# Altium integrated library GBA.IntLib: 80 symbols (continued)
## FH39-45S-0.3SHW(10) (continued)
FFC FPC Connectors Horizontal Mounting Angle Beige 0.3 mm - Pitch 45 Positions; Manufacturer: Hirose; Manufacturer Part Number: FH39-45S-0.3SHW(10); Supplier 1: Mouser; RoHS: Yes; Category: FFC / FPC; Stock 1: 11777; Pricing 1: 1=2,46000, 10=2,05000, 50=2,05000, 100=1,92000, 250=1,73000, 500=1,60000, 1000=1,37000, 2500=1,28000, 5000=1,21000, 10000=1,18000 (USD); ComponentLink1URL: https://datasheet.ciiva.com/5138/e58018001-27728-5138044.pdf?src-supplier=Mouser; ComponentLink1Description: https://datasheet.ciiva.com/5138/e58018001-27728-5138044.pdf?src-supplier=Mouser
footprint FH3945S03SHW10
pins: 1, 2, 3, 4, 5, 6, 7, 8, 9, 10, 11, 12, 13, 14, 15, 16, 17, 18, 19, 20, 21, 22, 23, 24, 25, 26, 27, 28, 29, 30, 31, 32, 33, 34, 35, 36, 37, 38, 39, 40, 41, 42, 43, 44, 45, 46, 47

## GBA Switch Original
designator SW?, comment Interruptor ON off original
Interruptor Original On OFF
footprint SWITCH_ORIGINAL
pins: 1, 2, 3, 4

## GCM1885C2A300JA16D
designator C?, comment 30pF 100V C0G 5%
Condensadores de cerámica multicapa (MLCC- SMD/SMT) 30pF 100Volts C0G 5%; Manufacturer: Murata; Manufacturer Part Number: GCM1885C2A300JA16D; Supplier 1: Mouser; Stock 1: 7933; Pricing 1: 1=0.15, 10=0.115, 50=0.115, 100=0.054, 1000=0.031, 10000=0.022 (USD); Mount: Surface Mount; Case/Package: 0603; Case Code (Imperial): 0603; Case Code (Metric): 1608; Min Operating Temperature: -25°C; Max Operating Temperature: 125°C; Voltage Rating: 100V; Capacitance: 30pF; Voltage Rating (DC): 100V; Tolerance: 5%; Packaging: Tape and Reel; Package Quantity: 4000; Dielectric: C0G; Termination: SMD/SMT; Length: 1.6mm; Height: 0.8mm; Width: 0.8mm; Thickness: 0.035inch; Depth: 0.8mm; Ratings: AEC-Q200; Radiation Hardening: No; ComponentLink1URL: http://search.murata.co.jp/Ceramy/image/img/w_hinm/S0717E.pdf?src-supplier=Digi-Key; ComponentLink1Description: http://search.murata.co.jp/Ceramy/image/img/w_hinm/S0717E.pdf?src-supplier=Digi-Key; ComponentLink2URL: http://www.murata.com/products/catalog/pdf/c03e.pdf?src-supplier=Avnet; ComponentLink2Description: http://www.murata.com/products/catalog/pdf/c03e.pdf?src-supplier=Avnet; Supplier Part Number 1: 81-GCM1885C2A300JA6D
footprint C 0603/1608
pins: 1, 2

## GRM21BR61E226ME44K
designator C?, comment 22uF X5R 25V 0805
Multilayer Ceramic Capacitors MLCC - SMD/SMT; Manufacturer: Murata; Manufacturer Part Number: GRM21BR61E226ME44K; Tolerance: 20%; Supplier 1: Mouser; Stock 1: 50478; Pricing 1: 1=0.54, 10=0.383, 50=0.383, 100=0.252, 1000=0.159, 10000=0.148 (USD); Mount: Surface Mount; Case/Package: 0805; Weight: 0.000335oz; Case Code (Imperial): 0805; Case Code (Metric): 2012; Min Operating Temperature: -55°C; Max Operating Temperature: 85°C; Packaging: Tape and Reel; Capacitance: 22uF; Voltage Rating: 25V; Dielectric: X5R; Termination: SMD/SMT; Composition: Ceramic; Voltage Rating (DC): 25V; Package Quantity: 10000; Length: 0.079inch; Height: 1.25mm; Width: 1.25mm; Thickness: 0.057inch; Supplier Part Number 1: 81-GRM21BR61E226ME4K
footprint C 0805/2012
pins: 1, 2

## GRM188R60J474KA01D
designator C?, comment 0.47uF 6.3 X5R 0603
CAP CER 0.47UF 6.3V X5R 0603; Manufacturer: Murata Electronics North America; Manufacturer Part Number: GRM188R60J474KA01D; Tolerance: ±10%; Notification: Current market demand for these product types have resulted in fluctuating and extending lead times. Lead times may differ.; Supplier 1: Digi-Key; RoHS: RoHS Compliant; Category: Capacitors; Stock 1: 40000; Pricing 1: 1=0.13, 10=0.092, 100=0.0467, 500=0.032, 1000=0.0283 (GBP); Packaging: Cut Tape (CT); Part Status: Not For New Designs; Voltage - Rated: 6.3V; Temperature Coefficient: X5R; Operating Temperature: -55°C ~ 85°C; Features: -; Ratings: -; Applications: General Purpose; Mounting Type: Surface Mount, MLCC; Package / Case: 0603 (1608 Metric); Size / Dimension: 0.063" L x 0.031" W (1.60mm x 0.80mm); Height - Seated (Max): -; Thickness (Max): 0.035" (0.90mm); Lead Spacing: -; Lead Style: -; ComponentLink1URL: https://www.murata.com/~/media/webrenewal/support/library/catalog/products/capacitor/mlcc/c02e.ashx?la=en-us; ComponentLink1Description: https://www.murata.com/~/media/webrenewal/support/library/catalog/products/capacitor/mlcc/c02e.ashx?la=en-us; Supplier Part Number 1: 490-1548-1-ND
footprint C 0603/1608
pins: 1, 2

## GRM188R61E106KA73D
designator C?, comment 10uF 25V X5R 0603
Cap Ceramic 10uF 25V X5R 10% SMD 0603 85°C Paper T/R; Manufacturer 1: Murata; Manufacturer Part Number 1: GRM188R61E106KA73D; Supplier 1: Mouser; Stock 1: 265910; Pricing 1: 1=0.37000, 10=0.25900, 50=0.25900, 100=0.15500, 500=0.11600, 1000=0.09800, 4000=0.07600, 8000=0.07000, 10000=0.07000, 12000=0.06300 (USD); RoHS: No; Case/Package: 0603; Supplier Part Number 1: 81-GRM188R61E106KA3D
footprint C 0603/1608
pins: 1, 2

## GRM188R61E225MA12D
designator C?, comment 2.2uF 25V X5R 0603
CAP CER 2.2UF 25V X5R 0603; Manufacturer 1: Murata; Manufacturer Part Number 1: GRM188R61E225MA12D; Tolerance: 20%; Supplier 1: Mouser; Stock 1: 103424; Pricing 1: 1=0,16000, 10=0,11500, 50=0,11500, 100=0,05400, 1000=0,03200, 10000=0,02300 (USD); RoHS: Yes; Mount: Surface Mount; Case/Package: 0603; Weight: 0.000222oz; Case Code (Metric): 1608; Case Code (Imperial): 0603; Min Operating Temperature: -55°C; Max Operating Temperature: 85°C; Capacitance: 2.2uF; Packaging: Tape and Reel; Voltage Rating: 25V; Dielectric: X5R; Termination: SMD/SMT; Composition: Ceramic; Voltage Rating (DC): 25V; Package Quantity: 4000; Length: 0.063inch; Height: 0.8mm; Width: 0.031inch; Thickness: 0.035inch; ComponentLink1URL: http://www.mouser.com/ds/2/281/c02e-2905.pdf?src-supplier=Mouser; ComponentLink1Description: http://www.mouser.com/ds/2/281/c02e-2905.pdf?src-supplier=Mouser; ComponentLink2URL: http://search.murata.co.jp/Ceramy/image/img/A01X/G101/ENG/GRM188R61E225MA12-01.pdf?src-supplier=Digi-Key; ComponentLink2Description: http://search.murata.co.jp/Ceramy/image/img/A01X/G101/ENG/GRM188R61E225MA12-01.pdf?src-supplier=Digi-Key; Supplier Part Number 1: 81-GRM188R61E225MA2D
footprint C 0603/1608
pins: 1, 2

## L/R Shoulder
designator J?, comment R/L Shoulder
Buy on Aliexpress
footprint SHOULDER_BUTTON
pins: GND, SH, SW

## LR2512-23R010F4
designator RSENSE?, comment Sense Resistor 0.01Ohm 3W 2512 1%
Low Resistors & Current Sense Resistors - Surface Mount 0.01Ohms ±1% 3W 2512 RoHS
footprint R2512
pins: 1, 2

## LTST-C281KGKT
designator LED?, comment Green 0402
Green 0603 130° Water Clear 35 mcd 2.4 V Surface Mount LED Chip; Manufacturer: Vishay Lite-On; Manufacturer Part Number: LTST-C281KGKT; Lens Color: Colorless; Power Rating: 75mW; Luminous Intensity: 35mcd; Forward Current: 20mA; Forward Voltage: 2V; Lens Style: Diffused,Colorless,Clear,Rectangular; Dominant Wavelength: 571nm; Number of Elements: 1; Reverse Voltage: 5V; Supplier 1: Mouser; RoHS: Yes; Category: LEDs; Stock 1: 168688; Pricing 1: 1=0,31000, 10=0,24500, 50=0,24500, 100=0,11100, 500=0,10000, 1000=0,08200, 5000=0,07100, 10000=0,05600, 25000=0,05300, 50000=0,04700 (USD); Mount: Surface Mount; Case/Package: SMD/SMT; Number of Pins: 2; Color: Green; Min Operating Temperature: -30°C; Max Operating Temperature: 85°C; Packaging: Tape and Reel; Viewing Angle: 130°; Package Quantity: 3000; Illumination Color: Green; Lens Transparency: Clear; Test Current: 20mA; Power Dissipation: 75mW; Number of LEDs: 1; Series: -; Length: 1mm; Width: 0.5mm; Height: 0.35mm; Depth: 0.5mm; Lead Free: Lead Free; RoHS Compliant: Yes; ComponentLink1URL: https://datasheet.ciiva.com/4269/dwonloadfilehandler-ashxtxtspecnods22-2008-0170-4269603.pdf?src-supplier=Arrow+Electronics; ComponentLink1Description: https://datasheet.ciiva.com/4269/dwonloadfilehandler-ashxtxtspecnods22-2008-0170-4269603.pdf?src-supplier=Arrow+Electronics; ComponentLink2URL: https://datasheet.ciiva.com/2958/s-110-ltst-c281kgkt-2958301.pdf?src-supplier=Digi-Key; ComponentLink2Description: https://datasheet.ciiva.com/2958/s-110-ltst-c281kgkt-2958301.pdf?src-supplier=Digi-Key; Supplier Part Number 1: 859-LTST-C281KGKT
footprint LED 0402
pins: 1 K, 2 A
text: GREEN

## LTST-C281TBKT
designator LED?, comment BLue 0402
0402 Blue Color Surface Mount LED With Water Clear Lens; Manufacturer: Vishay Lite-On; Manufacturer Part Number: LTST-C281TBKT; Lens Color: Colorless; Forward Voltage: 2.9V; Viewing Angle: 130°; Test Current: 5mA; Dominant Wavelength: 473nm; Luminous Intensity: 28mcd; Supplier 1: Mouser; RoHS: Yes; Category: LEDs; Stock 1: 18533; Pricing 1: 1=0,39000, 10=0,30600, 50=0,30600, 100=0,13800, 500=0,12500, 1000=0,10300, 5000=0,08800, 10000=0,07100, 25000=0,06600, 50000=0,05900 (USD); Mount: Surface Mount; Case/Package: 0402; Color: Blue; Case Code (Metric): 1005; Case Code (Imperial): 0402; Min Operating Temperature: -20°C; Max Operating Temperature: 80°C; Lens Style: Clear; Lens Transparency: Clear; Package Quantity: 3000; Illumination Color: Blue; Forward Current: 5mA; Packaging: Tape and Reel; Length: 1mm; Width: 0.5mm; Height: 0.35mm; Lead Free: Lead Free; ComponentLink1URL: http://optoelectronics.liteon.com/UpLoad/file/2009%20ShortForm%20-%20SMD%20LED%20(P022-P048).pdf?src-supplier=Future+Electronics; ComponentLink1Description: http://optoelectronics.liteon.com/UpLoad/file/2009%20ShortForm%20-%20SMD%20LED%20(P022-P048).pdf?src-supplier=Future+Electronics; Supplier Part Number 1: 859-LTST-C281TBKT
footprint LED 0402
pins: 1 K, 2 A
text: BLUE

## MAX17260SETD+
designator U?, comment Fuel Gauge MAX17260
Gestión de baterías 5.1 A 1-Cell Fuel Gauge with ModelGauge m5 EZ and Optional High-SideCurrent Sensing; Manufacturer: Maxim Integrated; Manufacturer Part Number: MAX17260SETD+; Empaquetado / Estuche: TDFN-EP-14; Producto: Fuel Gauges; Estilo de montaje: SMD/SMT; Tipo de batería: Li+, LiFePO4; CNHTS: 8542319000; Kit de desarrollo: MAX17260XEVKIT#; Temperatura operativa máxima: + 85 C; Temperatura operativa mínima: - 40 C; Corriente de suministro operativa: 15 uA; Voltaje operativo de suministro: 2.3 V to 4.9 V; Tipo de producto: Battery Management; Cantidad estándar de paquetes: 100; Subcategoría: PMIC - Power Management ICs; Product Status: New Product; Supplier 1: Mouser; RoHS: RoHS Compliant; Category: Gestión de baterías; Stock 1: 287; Pricing 1: 1=1.96, 25=1.34, 50=1.09, 250=1.07, 1000=1.01 (EUR); Serie: MAX17260; Marca: Maxim Integrated; HTS Code: 8542390001; Fabricante: Maxim Integrated; RoHS - Mouser: Y; Minimum Order Quantity: 1; Reeling: False; ComponentLink1URL: http://www.mouser.com/datasheet/2/256/MAX17260-1369516.pdf; ComponentLink1Description: http://www.mouser.com/datasheet/2/256/MAX17260-1369516.pdf; Supplier Part Number 1: 700-MAX17260SETD+
footprint TDFN14-1.7X2.3MM (T1433+2C Maxim code)
pins: 1 TH, 2 NC, 3 NC, 4 NC, 5 NC, 6 BATT, 7 CSN, 8 GND, 9 CSPL, 10 CSPH, 11 REG, 12 ALRT, 13 SDA, 14 SCL, 15 PAD

## MAX77757JEFG420+
designator U?, comment 3A USB C Charger  Supplier Part Number 1: MAX77757JEFG420+
Gestión de baterías 14V Input, 3A USB Type C Autonomous Charger; Manufacturer: Maxim; Supplier 1: Avnet; Manufacturer Part Number: MAX77757JEFG420+; RoHS: No; Pricing 1: 624=2,08051, 1248=2,01751, 2496=1,95451, 3744=1,89151, 4992=1,82851, 6240=1,76551, 62400=1,70251 (USD)
footprint 21-100385_90-100128_MXM (Footprint not found)
pins: 1 BST, 2 INOKB, 3 STAT, 4 CC2, 5 CC1, 6 DP, 7 DN, 8 ENBST, 9 GND, 10 VDD, 11 THM, 12 IFAST, 13 BATT, 14 BATT, 15 SYS, 16 SYS, 17 PVL, 18 PGND, 19 PGND, 20 LX, 21 LX, 22 BYP, 23 CHGIN, 24 CHGIN

## MAX98300ETA+T
designator U?, comment Mono Amplifier 2.6W
MAX98300 Series 5.5 V 2.6 W Class D Mono Surface Mount Audio Amplifier - TDFN-8; Manufacturer: Maxim; Manufacturer Part Number: MAX98300ETA+T; Voltage Gain: 12dB; Min Supply Voltage: 2.6V; Max Supply Voltage: 5.5V; Common Mode Rejection Ratio: 50dB; Max Power Dissipation: 953.5mW; Nominal Supply Current: 2mA; Power Supply Rejection Ratio (PSRR): 70dB; Number of Channels: 1; Max Output Current: 600mA; Load Impedance: 4R; Supplier 1: Mouser; RoHS: Yes; Category: Amplifiers - Audio; Stock 1: 8609; Pricing 1: 1=1,59000, 10=1,44000, 25=1,35000, 50=1,35000, 100=1,16000, 250=1,08000, 500=0,94500, 1000=0,81000, 10000=0,78200 (USD); Mount: Surface Mount; Number of Pins: 8; Contact Plating: Tin,Matte; Min Operating Temperature: -40°C; Max Operating Temperature: 85°C; Package Quantity: 2500; Packaging: Tape and Reel; Output Power: 2.6W; Max Output Power: 2.6W; Series: -; Supply Current: 2mA; Radiation Hardening: No; REACH SVHC: Unknown; RoHS Compliant: Yes; ComponentLink1URL: https://datasheet.ciiva.com/29639/max98300-29639253.pdf?src-supplier=Digi-Key; ComponentLink1Description: https://datasheet.ciiva.com/29639/max98300-29639253.pdf?src-supplier=Digi-Key; ComponentLink2URL: https://datasheet.ciiva.com/2968/max98300-2968003.pdf?src-supplier=Avnet; ComponentLink2Description: https://datasheet.ciiva.com/2968/max98300-2968003.pdf?src-supplier=Avnet; Supplier Part Number 1: 700-MAX98300ETA+T
footprint SON50P200X200X80-9N-D
pins: 1 IN+, 2 IN-, 3 ~{SHDN}, 4 GAIN, 5 PGND, 6 OUT-, 7 OUT+, 8 PVDD, 9 EP

## MIC2877-AYFT-TR
designator U?, comment Boost adjustable 2A
Conv DC-DC 2.5V to 5.5V Synchronous Step Up Single-Out 2.5V to 5.5V 2A 8-Pin FTQFN T/R; Manufacturer: Microchip; Manufacturer Part Number: MIC2877-AYFT-TR; Supplier 1: Mouser; RoHS: Yes; Category: Voltage Regulators - Switching; Stock 1: 4903; Pricing 1: 1=1,17000, 10=1,17000, 50=0,98600, 100=0,90000, 1000=0,90000, 10000=0,89900 (USD); Mount: Surface Mount; Number of Pins: 8; Packaging: Tape and Reel; RoHS Compliant: Yes; ComponentLink1URL: http://www.microchip.com/mymicrochip/filehandler.aspx?ddocname=en601345&src-supplier=Digi-Key; ComponentLink1Description: http://www.microchip.com/mymicrochip/filehandler.aspx?ddocname=en601345&src-supplier=Digi-Key; Supplier Part Number 1: 579-MIC2877-AYFT-TR
footprint MIC2877AYFTTR
pins: 1 VIN, 2 AGND, 3 PGND, 4 SW, 5 VOUT, 6 EN, 7 FB, 8 PG

## MMZ1608B121CTAH0
designator B?, comment 120OHM 0603 1LN
FERRITE BEAD 120 OHM 0603 1LN; Manufacturer: TDK Corporation; Manufacturer Part Number: MMZ1608B121CTAH0; Filter Type: Signal Line; Current Rating (Max): 600mA; DC Resistance (DCR) (Max): 150 mOhm; Supplier 1: Digi-Key; RoHS: RoHS Compliant; Category: Filters; Stock 1: 139504; Pricing 1: 1=0.09, 10=0.062, 25=0.056, 50=0.0504, 100=0.0371, 250=0.02692, 500=0.02468, 1000=0.02132 (EUR); Packaging: Cut Tape (CT); Part Status: Active; Ratings: -; Operating Temperature: -55°C ~ 125°C; Package / Case: 0603 (1608 Metric); Mounting Type: Surface Mount; Height (Max): 0.030" (0.75mm); Size / Dimension: 0.063" L x 0.032" W (1.60mm x 0.80mm); ComponentLink1URL: https://product.tdk.com/info/en/catalog/datasheets/beads_commercial_signal_mmz1608_en.pdf; ComponentLink1Description: https://product.tdk.com/info/en/catalog/datasheets/beads_commercial_signal_mmz1608_en.pdf; Supplier Part Number 1: 445-2164-1-ND
footprint R 0603/1608
pins: 1, 2

## NCP15XH103F03RC
designator THR?, comment NTC 10K 3380K 0402
THERMISTOR NTC 10KOHM 3380K 0402; Manufacturer: Murata Electronics North America; Manufacturer Part Number: NCP15XH103F03RC; Resistance Tolerance: ±1%; B25/85: 3434K; B25/100: 3455K; Supplier 1: Digi-Key; RoHS: RoHS Compliant; Category: Sensors, Transducers; Stock 1: 432156; Pricing 1: 1=0.11, 5=0.106, 10=0.094, 25=0.0868, 50=0.0696, 100=0.0596, 500=0.05216, 1000=0.04471, 5000=0.03974 (GBP); Packaging: Cut Tape (CT); Part Status: Active; Resistance in Ohms @ 25°C: 10k; B Value Tolerance: ±1%; B0/50: -; B25/50: 3380K; B25/75: -; Operating Temperature: -40°C ~ 125°C; Length - Lead Wire: -; Mounting Type: Surface Mount; Package / Case: 0402 (1005 Metric); ComponentLink1URL: https://www.murata.com/en-us/api/pdfdownloadapi?cate=&partno=NCP15XH103F03RC; ComponentLink1Description: https://www.murata.com/en-us/api/pdfdownloadapi?cate=&partno=NCP15XH103F03RC; Supplier Part Number 1: 490-4801-1-ND
footprint R 0402/1005
pins: 1, 2

## NRH2410T6R8MN
designator L?, comment 6.8uH 0,.7A  Supplier Part Number 1: 963-NRH2410T6R8MN
Inductor Power Shielded Wirewound 6.8uH 20% 100KHz Ferrite 0.57A 0.492Ohm DCR T/R; Manufacturer: Taiyo Yuden; Manufacturer Part Number: NRH2410T6R8MN; Current Rating: 570mA; Saturation Current: 750mA; Self Resonant Frequency: 43MHz; DC Resistance (DCR): 492mR; Supplier 1: Mouser; RoHS: Yes; Category: Fixed Inductors; Stock 1: 34335; Pricing 1: 1=0,23000, 10=0,15400, 50=0,15400, 100=0,12400, 1000=0,09100, 10000=0,06800 (USD); Mount: Surface Mount; Case/Package: Nonstandard; Number of Pins: 2; Core Material: Ferrite; Min Operating Temperature: -25°C; Max Operating Temperature: 120°C; Tolerance: 20%; Shielding: Shielded; Packaging: Tape and Reel; Inductance: 6.8uH; Resistor Type: Wirewound; Test Frequency: 100kHz; Package Quantity: 2500; Inductance Tolerance: 20%; Max DC Current: 750mA; Termination: SMD/SMT; Series: NRH; Length: 2.4mm; Width: 0.094inch; Height: 1mm; Height - Seated (Max): 0.039inch; Lead Pitch: 1.45mm; Depth: 2.5mm; Radiation Hardening: No; RoHS Compliant: Yes; REACH SVHC: No SVHC; Halogen Free: Halogen Free; ComponentLink1URL: https://datasheet.ciiva.com/1043/nrh2410t6r8mn-ss-1043809.pdf?src-supplier=Digi-Key; ComponentLink1Description: https://datasheet.ciiva.com/1043/nrh2410t6r8mn-ss-1043809.pdf?src-supplier=Digi-Key; ComponentLink2URL: https://datasheet.ciiva.com/8502/nrh2410t6r8mn-ss-8502817.pdf?src-supplier=Avnet; ComponentLink2Description: https://datasheet.ciiva.com/8502/nrh2410t6r8mn-ss-8502817.pdf?src-supplier=Avnet; ComponentLink3URL: https://datasheet.ciiva.com/25606/0900766b810b3cd2-25606903.pdf?src-supplier=RSComponents; ComponentLink3Description: https://datasheet.ciiva.com/25606/0900766b810b3cd2-25606903.pdf?src-supplier=RSComponents
footprint NRH2410T6R8MN
pins: 1, 2

## NSR0240HT1G
designator D?, comment 40V 250mA SOD323  Supplier Part Number 1: 863-NSR0240HT1G
DIODE SCHOTTKY 40V 250MA SOD323; Manufacturer: ON Semiconductor; Manufacturer Part Number: NSR0240HT1G; Max Surge Current: 1A; Recovery Time: 3ns; Peak Reverse Current: 10uA; Forward Voltage: 710mV; Power Dissipation: 270mW; Element Configuration: Single; Supplier 1: Mouser; RoHS: Yes; Stock 1: 30582; Pricing 1: 1 = 0,23000, 10 = 0,15400, 50 = 0,15400, 100 = 0,06500, 1000 = 0,04400, 10000 = 0,03000 (USD); Case/Package: SOD-323-2; Number of Pins: 2; Contact Plating: Tin; Min Operating Temperature: -55°C; Max Operating Temperature: 150°C; Package Quantity: 1; Forward Current: 250mA; Packaging: Tape and Reel; Max Reverse Leakage Current: 10uA; Average Rectified Current: 250mA; Reverse Recovery Time: 3ns; Max Repetitive Reverse Voltage (Vrrm): 40V; Peak Non-Repetitive Surge Current: 1A; Max Forward Surge Current (Ifsm): 1A; Max Reverse Voltage (DC): 40V; Length: 1.8mm; Height: 1mm; Width: 1.35mm; Radiation Hardening: No; REACH SVHC: No SVHC; Lead Free: Lead Free; ComponentLink1URL: https://datasheet.ciiva.com/4714/nsr0240h-d-113658-4714368.pdf?src-supplier=Mouser; ComponentLink1Description: https://datasheet.ciiva.com/4714/nsr0240h-d-113658-4714368.pdf?src-supplier=Mouser; ComponentLink2URL: https://datasheet.ciiva.com/8293/nsr0240h-d-8293840.pdf?src-supplier=Avnet; ComponentLink2Description: https://datasheet.ciiva.com/8293/nsr0240h-d-8293840.pdf?src-supplier=Avnet; ComponentLink3URL: https://datasheet.ciiva.com/25949/nsr0240h-d-25949637.pdf?src-supplier=Avnet+Europe; ComponentLink3Description: https://datasheet.ciiva.com/25949/nsr0240h-d-25949637.pdf?src-supplier=Avnet+Europe; ComponentLink4URL: https://datasheet.ciiva.com/915/nsr0240h-d-915416.pdf?src-supplier=Digi-Key; ComponentLink4Description: https://datasheet.ciiva.com/915/nsr0240h-d-915416.pdf?src-supplier=Digi-Key; ComponentLink5URL: https://datasheet.ciiva.com/915/nsr0240h-d-915417.pdf?src-supplier=Digi-Key; ComponentLink5Description: https://datasheet.ciiva.com/915/nsr0240h-d-915417.pdf?src-supplier=Digi-Key; ComponentLink6URL: https://datasheet.ciiva.com/16396/nsr0240h-d-16396521.pdf?src-supplier=Future+Electronics; ComponentLink6Description: https://datasheet.ciiva.com/16396/nsr0240h-d-16396521.pdf?src-supplier=Future+Electronics; ComponentLink7URL: https://datasheet.ciiva.com/915/nsr0240h-d-915418.pdf?src-supplier=Digi-Key; ComponentLink7Description: https://datasheet.ciiva.com/915/nsr0240h-d-915418.pdf?src-supplier=Digi-Key; ComponentLink8URL: https://datasheet.ciiva.com/7963/nsr0240h-d-7963165.pdf?src-supplier=Element14; ComponentLink8Description: https://datasheet.ciiva.com/7963/nsr0240h-d-7963165.pdf?src-supplier=Element14
footprint SOD-323
pins: 1 K, 2 A

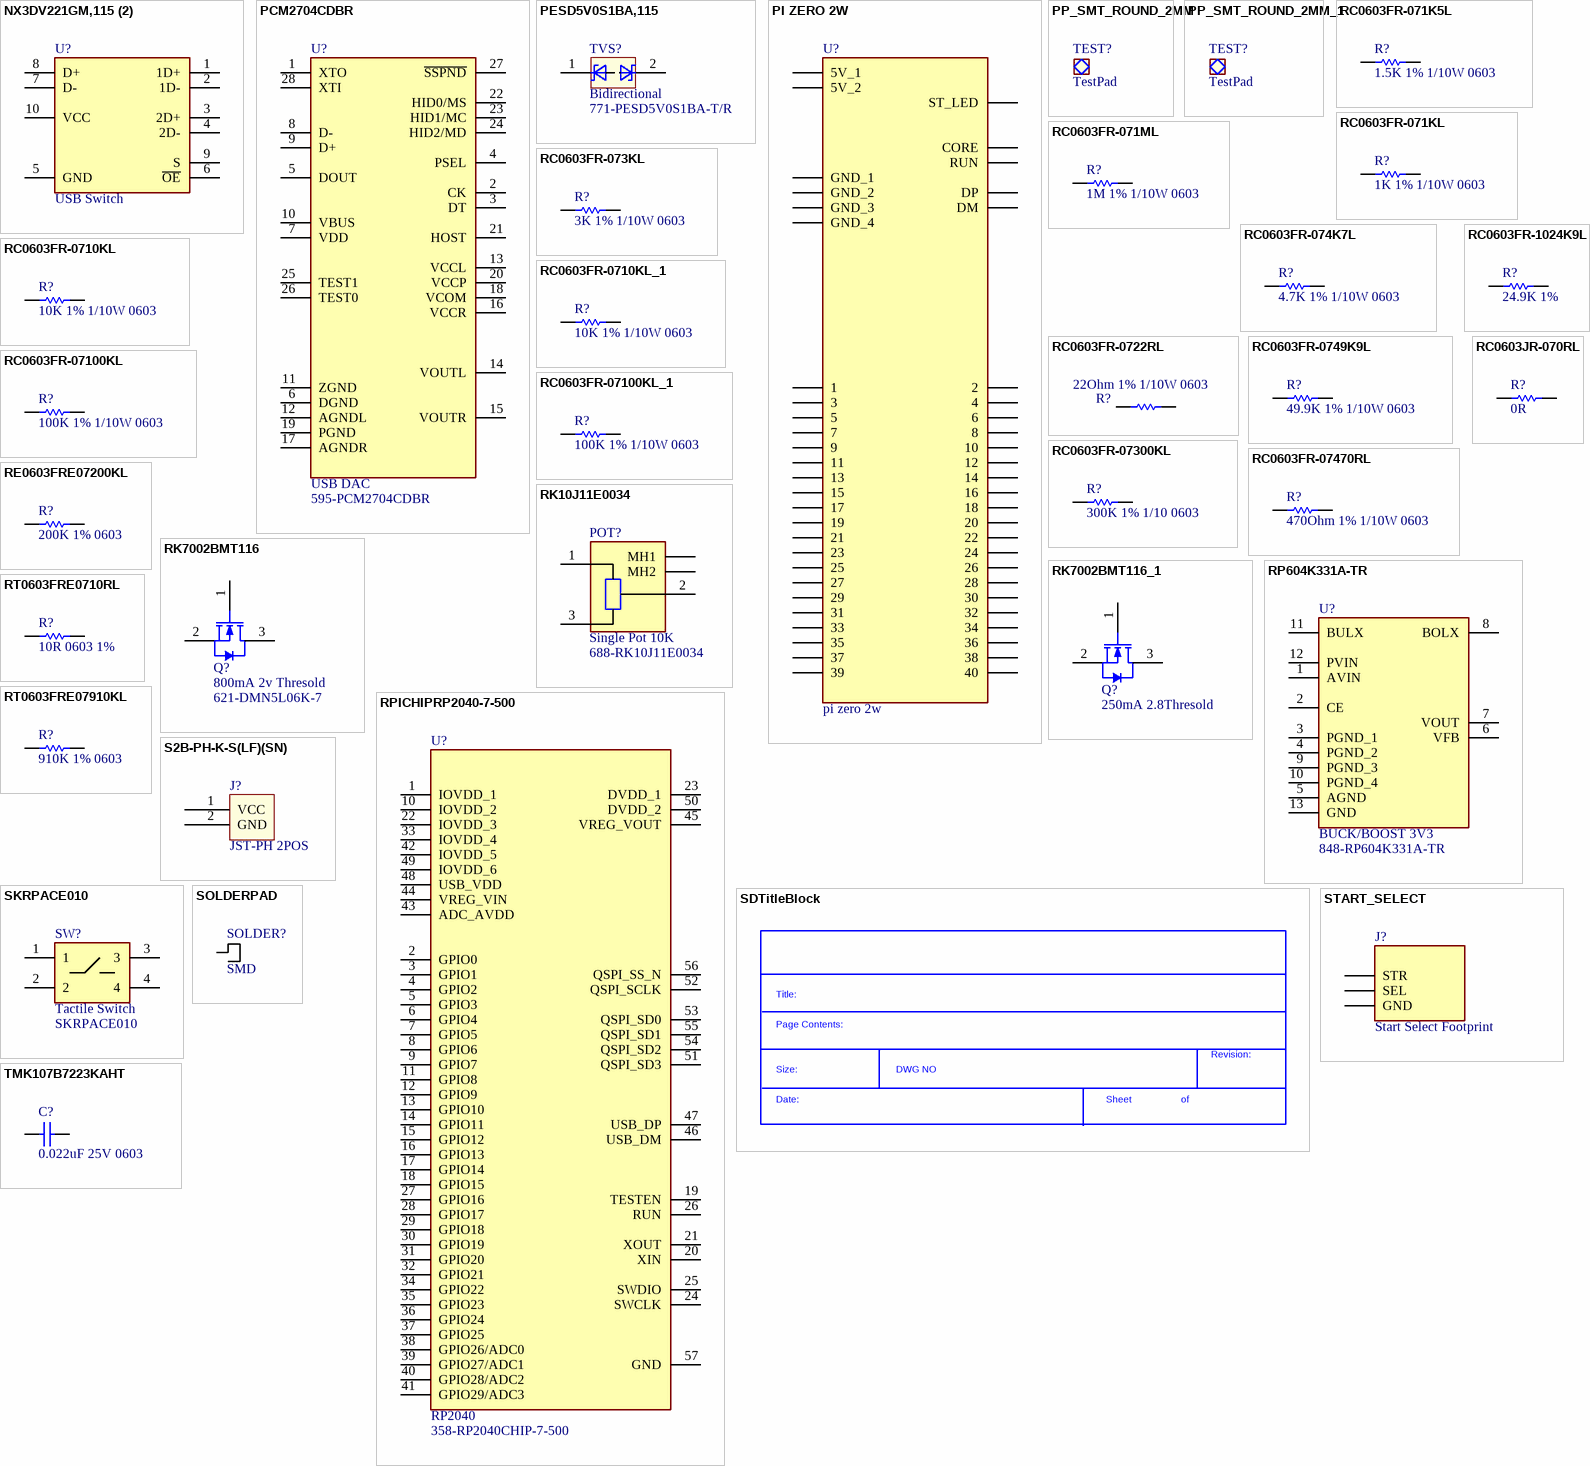
[diagram p1: symbols NX3DV221GM,115 (2) to TMK107B7223KAHT]

## NX3DV221GM,115 (2)
designator U?, comment USB Switch
Analog Switch Single SPDT 10-Pin XQFN T/R; Manufacturer: NXP Semiconductors; Manufacturer Part Number: NX3DV221GM,115; Number of Inputs: 2; Number of Outputs: 4; Number of Channels: 1; Min Supply Voltage: 2.3V; Operating Supply Voltage: 3V; Max Supply Voltage: 3.6V; On-State Resistance: 7R; Operating Supply Current: 10nA; Power Dissipation: 250mW; Polarity: Non-Inverting; High Level Output Current: 120mA; Supplier 1: Mouser; RoHS: Yes; Category: Decoders and Multiplexers; Stock 1: 3680; Pricing 1: 1=0,98000, 10=0,85800, 50=0,85800, 100=0,65800, 1000=0,49100, 10000=0,49000 (USD); Mount: Surface Mount; Number of Pins: 10; Min Operating Temperature: -40°C; Max Operating Temperature: 85°C; Packaging: Tape and Reel; Package Quantity: 5000; Throw Configuration: SPDT; Supply Type: Single; Low Level Output Current: 120mA; Max Power Dissipation: 250mW; Series: -; Radiation Hardening: No; Lead Free: Lead Free; ComponentLink1URL: https://datasheet.ciiva.com/6637/nx3dv221-6637624.pdf?src-supplier=Digi-Key; ComponentLink1Description: https://datasheet.ciiva.com/6637/nx3dv221-6637624.pdf?src-supplier=Digi-Key; ComponentLink2URL: https://datasheet.ciiva.com/11581/nx3dv221-11581020.pdf?src-supplier=Avnet; ComponentLink2Description: https://datasheet.ciiva.com/11581/nx3dv221-11581020.pdf?src-supplier=Avnet; Supplier Part Number 1: 771-NX3DV221GM115
footprint NX3DV221GM115
pins: 1 1D+, 2 1D-, 3 2D+, 4 2D-, 5 GND, 6 ~{OE}, 7 D-, 8 D+, 9 S, 10 VCC

## PCM2704CDBR
designator U?, comment USB DAC  Supplier Part Number 1: 595-PCM2704CDBR
PCM2704C 98DB Snr Stereo Full Sp; Manufacturer: Texas Instruments; Manufacturer Part Number: PCM2704CDBR; Number of DAC Channels: 0; Number of Channels: 2; Max Supply Voltage: 5.25V; Min Supply Voltage: 3V; Interface: Serial,SPI,USB; Resolution: 16b; Sampling Rate: 48000S/s; Supply Type: Analog,Digital; Conversion Rate: 48KS/s; Output Type: Voltage; Operating Supply Voltage: 5V; Supplier 1: Mouser; RoHS: Yes; Category: Amplifiers - Audio; Stock 1: 1234; Pricing 1: 1=9,13000, 10=8,25000, 25=7,86000, 50=7,86000, 100=6,83000, 250=6,52000, 500=5,95000, 1000=5,57000, 2000=5,56000, 10000=5,56000 (USD); Mount: Surface Mount; Case/Package: SSOP; Number of Pins: 28; Min Operating Temperature: -25°C; Max Operating Temperature: 85°C; Packaging: Tape and Reel; Package Quantity: 2000; Number of Converters: 2; Signal to Noise Ratio (SNR): 98dB; Number of Analog Inputs: 0; Number of Analog Outputs: 2; Series: PCM2704C; Radiation Hardening: No; Lead Free: Lead Free; RoHS Compliant: Yes; ComponentLink1URL: https://datasheet.ciiva.com/1825/pcm2704c-1825851.pdf?src-supplier=Digi-Key; ComponentLink1Description: https://datasheet.ciiva.com/1825/pcm2704c-1825851.pdf?src-supplier=Digi-Key; ComponentLink2URL: https://datasheet.ciiva.com/1825/pcm2704c-1825852.pdf?src-supplier=Digi-Key; ComponentLink2Description: https://datasheet.ciiva.com/1825/pcm2704c-1825852.pdf?src-supplier=Digi-Key; ComponentLink3URL: https://datasheet.ciiva.com/1825/pcm2704c-1825853.pdf?src-supplier=Digi-Key; ComponentLink3Description: https://datasheet.ciiva.com/1825/pcm2704c-1825853.pdf?src-supplier=Digi-Key
footprint SOP65P780X200-28N
pins: 1 XTO, 2 CK, 3 DT, 4 PSEL, 5 DOUT, 6 DGND, 7 VDD, 8 D-, 9 D+, 10 VBUS, 11 ZGND, 12 AGNDL, 13 VCCL, 14 VOUTL, 15 VOUTR, 16 VCCR, 17 AGNDR, 18 VCOM, 19 PGND, 20 VCCP, 21 HOST, 22 HID0/MS, 23 HID1/MC, 24 HID2/MD, 25 TEST1, 26 TEST0, 27 ~{SSPND}, 28 XTI

## PESD5V0S1BA,115
designator TVS?, comment Bidirectional  Supplier Part Number 1: 771-PESD5V0S1BA-T/R
PESD Series 14 V 45 pF Bi-Directional ESD Protection Diode - SOD-323; Manufacturer: Nexperia; Manufacturer Part Number: PESD5V0S1BA,115; Supplier 1: Mouser; RoHS: Yes; Category: ESD and Circuit Protection ICs; Pricing 1: 1=0,40000, 10=0,30800, 50=0,30800, 100=0,17500, 1000=0,08900, 10000=0,06900 (USD); RoHS Compliant: Yes; ComponentLink1URL: http://www.farnell.com/datasheets/461331.pdf?src-supplier=Farnell; ComponentLink1Description: http://www.farnell.com/datasheets/461331.pdf?src-supplier=Farnell; ComponentLink2URL: https://assets.nexperia.com/documents/data-sheet/PESD5V0S1BA_BB_BL.pdf?src-supplier=Digi-Key; ComponentLink2Description: https://assets.nexperia.com/documents/data-sheet/PESD5V0S1BA_BB_BL.pdf?src-supplier=Digi-Key
footprint SOD2512X110N
pins: 1 K1, 2 K2

## PI ZERO 2W
designator U?, comment pi zero 2w
Comprar los pogo 575-906015  x 60 y los de los tornillos x4 710-9774025151R
footprint Pi 2 Zero W
pins: 1, 2, 3, 4, 5, 5V_1, 5V_2, 6, 7, 8, 9, 10, 11, 12, 13, 14, 15, 16, 17, 18, 19, 20, 21, 22, 23, 24, 25, 26, 27, 28, 29, 30, 31, 32, 33, 34, 35, 36, 37, 38, 39, 40, CORE, DM, DP, GND_1, GND_2, GND_3, GND_4, RUN, ST_LED

## PP_SMT_ROUND_2MM
designator TEST?, comment TestPad  (no BOM)
Probe Pad, SMT, ROUND, 2.0MM
footprint TestPad
pins: 1

## PP_SMT_ROUND_2MM_1
designator TEST?, comment TestPad  (no BOM)
Probe Pad, SMT, ROUND, 2.0MM
footprint TestPad
pins: 1

## RC0603FR-071K5L
designator R?, comment 1.5K 1% 1/10W 0603
RES SMD 1.5K OHM 1% 1/10W 0603; Manufacturer: Yageo; Manufacturer Part Number: RC0603FR-071K5L; Resistance: 1.5kR; Temperature Coefficient: 100ppm/°C; Voltage Rating (DC): 50V; Power Rating: 100mW; Supplier 1: Mouser; RoHS: Yes; Stock 1: 1280962; Pricing 1: 1 = 0,10000, 10 = 0,01800, 50 = 0,01800, 100 = 0,00600, 1000 = 0,00500, 10000 = 0,00300 (USD); Case/Package: 0603; Number of Pins: 2; Case Code (Metric): 1608; Case Code (Imperial): 0603; Min Operating Temperature: -55°C; Max Operating Temperature: 155°C; Tolerance: 1%; Packaging: Tape and Reel; Composition: Thick Film; Voltage Rating: 50V; Package Quantity: 1; Number of Terminations: 2; Termination: SMD/SMT; Military Standard: Not; Max Power Dissipation: 100mW; Features: Moisture Resistant; Length: 0.063inch; Height: 0.022inch; Width: 0.031inch; Depth: 0.8mm; REACH SVHC: No SVHC; Lead Free: Lead Free; ComponentLink1URL: https://datasheet.ciiva.com/2454/pyu-r-int-thick-7-2454513.pdf?src-supplier=Digi-Key; ComponentLink1Description: https://datasheet.ciiva.com/2454/pyu-r-int-thick-7-2454513.pdf?src-supplier=Digi-Key; ComponentLink2URL: https://datasheet.ciiva.com/2454/pyu-r-int-thick-7-2454514.pdf?src-supplier=Digi-Key; ComponentLink2Description: https://datasheet.ciiva.com/2454/pyu-r-int-thick-7-2454514.pdf?src-supplier=Digi-Key; ComponentLink3URL: https://datasheet.ciiva.com/2454/pyu-r-int-thick-7-2454515.pdf?src-supplier=Digi-Key; ComponentLink3Description: https://datasheet.ciiva.com/2454/pyu-r-int-thick-7-2454515.pdf?src-supplier=Digi-Key; ComponentLink4URL: https://datasheet.ciiva.com/46440/1868787-46440895.pdf?src-supplier=Element14; ComponentLink4Description: https://datasheet.ciiva.com/46440/1868787-46440895.pdf?src-supplier=Element14; Supplier Part Number 1: 603-RC0603FR-071K5L
footprint R 0603/1608
pins: 1, 2

## RC0603FR-071KL
designator R?, comment 1K 1% 1/10W 0603
RES SMD 1K OHM 1% 1/10W 0603; Manufacturer: Yageo; Manufacturer Part Number: RC0603FR-071KL; Power (Watts): 0.1W, 1/10W; Temperature Coefficient: ±100ppm/°C; Supplier 1: Digi-Key; RoHS: RoHS Compliant; Category: Resistors; Stock 1: 8170163; Pricing 1: 1=0.08, 10=0.013, 100=0.005, 1000=0.00224, 2500=0.00195 (EUR); Packaging: Cut Tape (CT); Part Status: Active; Tolerance: ±1%; Composition: Thick Film; Features: Moisture Resistant; Operating Temperature: -55°C ~ 155°C; Package / Case: 0603 (1608 Metric); Supplier Device Package: 0603; Size / Dimension: 0.063" L x 0.032" W (1.60mm x 0.80mm); Height - Seated (Max): 0.022" (0.55mm); Failure Rate: -; ComponentLink1URL: http://www.yageo.com/documents/recent/PYu-RC_Group_51_RoHS_L_8.pdf; ComponentLink1Description: http://www.yageo.com/documents/recent/PYu-RC_Group_51_RoHS_L_8.pdf; Supplier Part Number 1: 311-1.00KHRCT-ND
footprint R 0603/1608
pins: 1, 2

## RC0603FR-071ML
designator R?, comment 1M 1% 1/10W 0603
RES SMD 1M OHM 1% 1/10W 0603; Manufacturer 1: Yageo; Manufacturer Part Number 1: RC0603FR-071ML; Voltage Rating: 50V; Resistance: 1MR; Power Rating: 100mW; Temperature Coefficient: 100ppm/°C; Supplier 1: Digi-Key; Stock 1: 9751331; Pricing 1: 1=0,10000, 10=0,02400, 100=0,00970, 1000=0,00437, 2500=0,00379 (USD); RoHS: Yes; Case/Package: 0603; Number of Pins: 2; Case Code (Imperial): 0603; Case Code (Metric): 1608; Min Operating Temperature: -55°C; Max Operating Temperature: 155°C; Voltage Rating (DC): 50V; Tolerance: 1%; Packaging: Tape and Reel; Package Quantity: 5000; Termination: SMD/SMT; Composition: Thick Film; Military Standard: Not; Length: 1.6mm; Height: 0.45mm; Width: 0.8mm; Depth: 0.8mm; REACH SVHC: No SVHC; Lead Free: Lead Free; ComponentLink1URL: https://datasheet.ciiva.com/11819/0900766b80f96399-11819295.pdf?src-supplier=RSComponents; ComponentLink1Description: https://datasheet.ciiva.com/11819/0900766b80f96399-11819295.pdf?src-supplier=RSComponents; ComponentLink2URL: https://datasheet.ciiva.com/7983/443971-7983614.pdf?src-supplier=Element14; ComponentLink2Description: https://datasheet.ciiva.com/7983/443971-7983614.pdf?src-supplier=Element14; ComponentLink3URL: https://datasheet.ciiva.com/12555/rc0603-272842-12555388.pdf?src-supplier=Mouser; ComponentLink3Description: https://datasheet.ciiva.com/12555/rc0603-272842-12555388.pdf?src-supplier=Mouser; Supplier Part Number 1: 311-1.00MHRDKR-ND
footprint R 0603/1608
pins: 1, 2

## RC0603FR-073KL
designator R?, comment 3K 1% 1/10W 0603